# Altium schematic symbol library LimeMicroAltiumLib_schLib_r01.SchLib: 328 symbols (part 8 of 9)
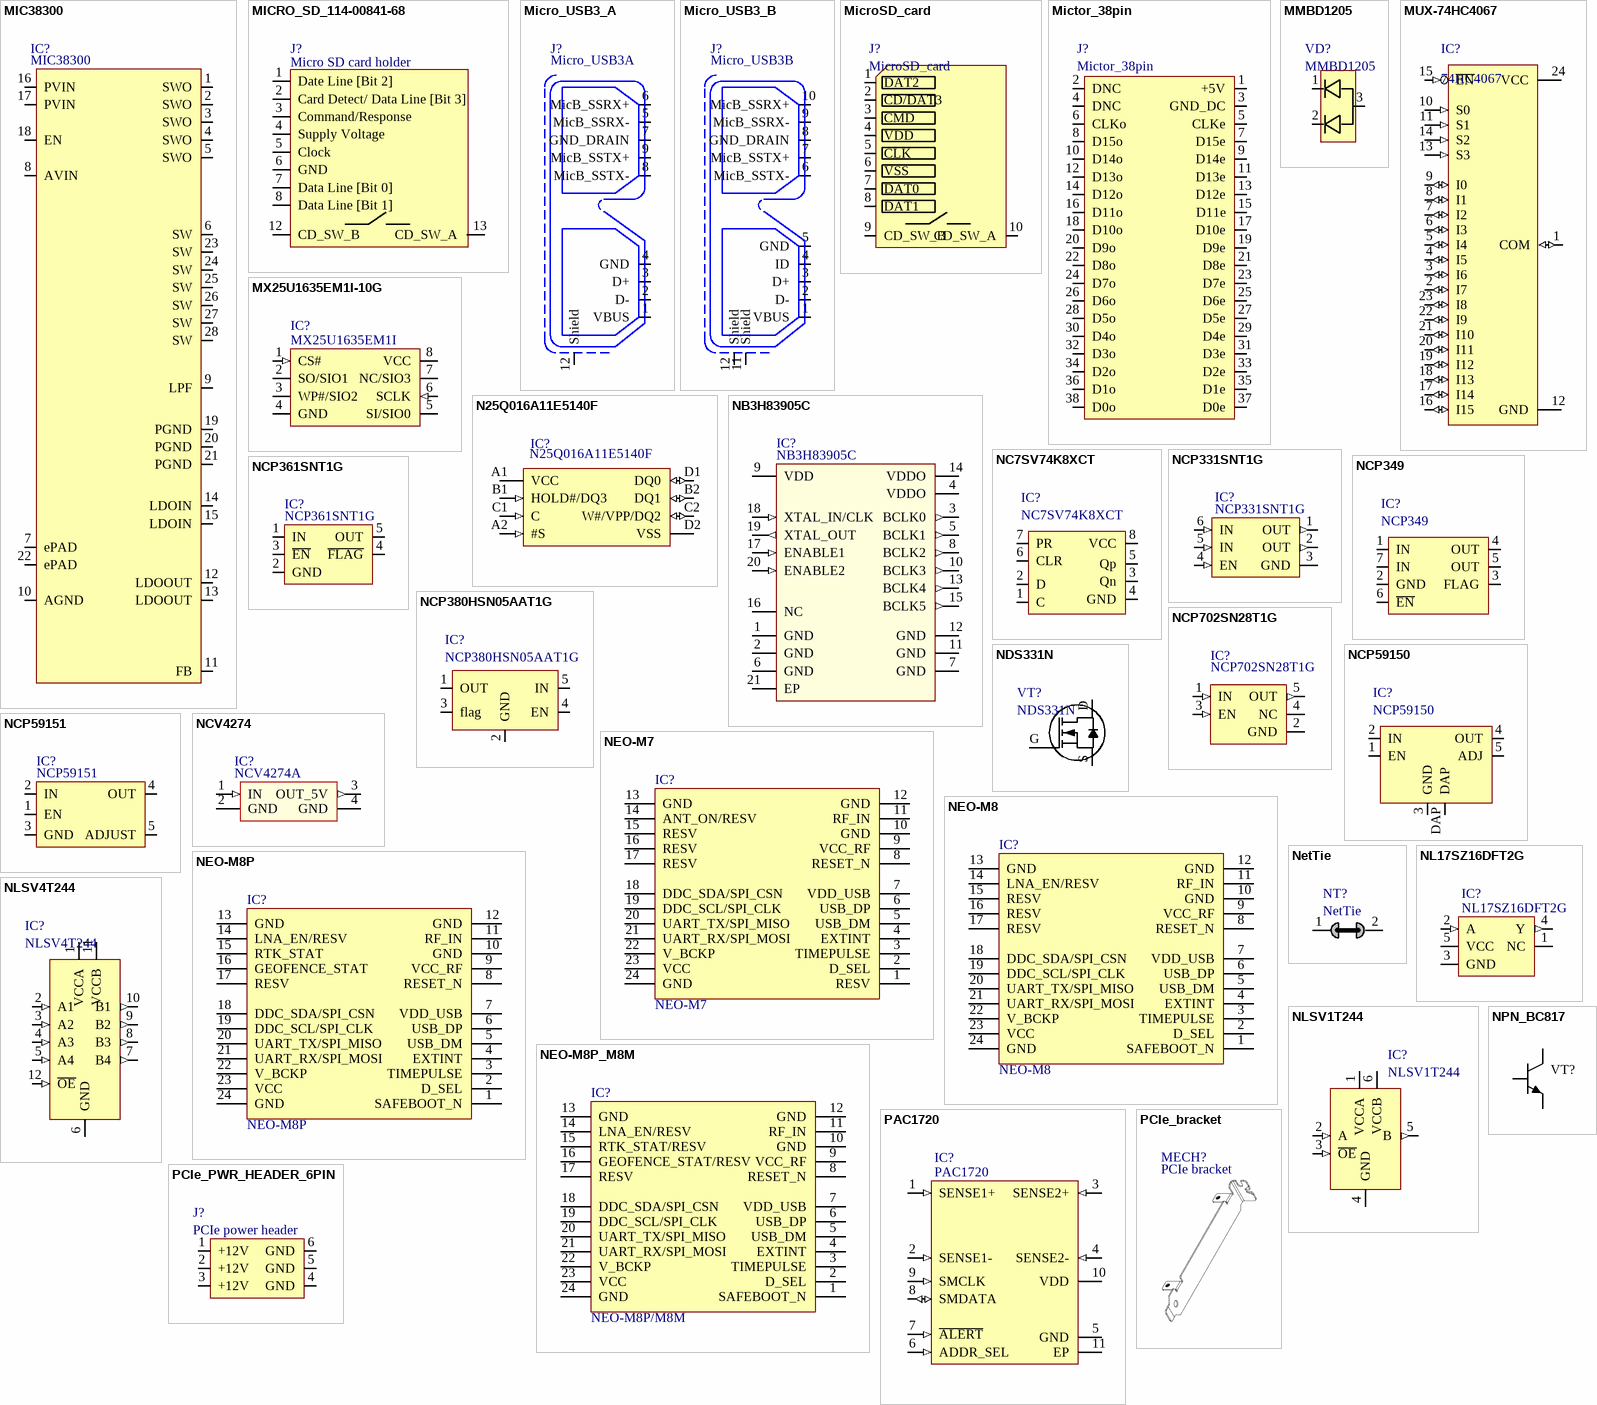
[diagram p54: symbols MIC38300 to PCIe_PWR_HEADER_6PIN]

## MMBD1205
designator VD?
Reverse Recovery Time (trr): 4ns; Diode Configuration: 1 Pair Common Anode; Voltage - DC Reverse (Vr) (Max): 100V; Current - Average Rectified (Io) (per Diode): 200mA; Current - Reverse Leakage @ Vr: 50nA @ 50V; Voltage - Forward (Vf) (Max) @ If: 1V @ 200mA; Supplier 1: Digi-Key; Category: Discrete Semiconductor Products; Supplier Device Package: SOT-23-3 (TO-236); Package / Case: TO-236-3, SC-59, SOT-23-3; Supplier Part Number 1: MMBD1205CT-ND
footprint SOT23-3_v2 (SOT23, 3 pin)
pins: 1, 2, 3

## MUX-74HC4067
designator IC?, comment 74HC4067
MUX-74HC4067; Manufacturer Part Number 1: 74HC4067PW,118; Manufacturer: NXP Semiconductors; Function: Multiplexer/Demultiplexer; On-State Resistance: 120 Ohm; Circuit: 1 x 1:16; Current - Supply: 16µA; Voltage - Supply, Single/Dual (±): 2 V ~ 10 V; Voltage Supply Source: Single Supply; Supplier 1: Digi-Key; Mounting Type: Surface Mount; Supplier Device Package: 24-TSSOP; Packaging: Tape & Reel (TR); RoHS: RoHS Compliant; Operating Temperature: -40°C ~ 125°C; Category: Integrated Circuits (ICs); Package / Case: 24-TSSOP (0.173", 4.40mm Width); Supplier Part Number 1: 74HC4067PW,118-ND
footprint SSOP-24 (SOP, 24-Leads, Body 8,5x5,6mm (max), Pitch 0,65mm, IPC Medium Density)
footprint SSOP-24 (SOP, 24-Leads, Body 8,5x5,6mm (max), Pitch 0,65mm, IPC Medium Density)
pins: 1 COM (io), 2 I7 (io), 3 I6 (io), 4 I5 (io), 5 I4 (io), 6 I3 (io), 7 I2 (io), 8 I1 (io), 9 I0 (io), 10 S0 (in), 11 S1 (in), 12 GND (power), 13 S3 (in), 14 S2 (in), 15 ~{EN} (in), 16 I15 (io), 17 I14 (io), 18 I13 (io), 19 I12 (io), 20 I11 (io), 21 I10 (io), 22 I9 (io), 23 I8 (io), 24 VCC (power)

## MX25U1635EM1I-10G
designator IC?, comment MX25U1635EM1I
Manufacturer: Macronix; Manufacturer Part Number: MX25U1635EM1I-10G; Part Description: FLASH - NOR Memory IC 16Mb (2M x 8) SPI 104MHz 8-SOP; Memory Type: Non-Volatile; Memory Format: FLASH; Memory Size: 16Mb (2M x 8); Write Cycle Time - Word, Page: 30µs, 3ms; Memory Interface: SPI; Voltage - Supply: 1.65 V ~ 2 V; Supplier 1: Digi-Key; RoHS: RoHS Compliant; Category: Integrated Circuits (ICs); Stock 1: 29792; Pricing 1: 1=1.27, 500=0.98924 (USD); Packaging: Tube; Part Status: Not For New Designs; Technology: FLASH - NOR; Operating Temperature: -40°C ~ 85°C (TA); Mounting Type: Surface Mount; Package / Case: 8-SOIC (0.154", 3.90mm Width); Supplier Device Package: 8-SOP; ComponentLink1URL: http://www.macronix.com/Lists/Datasheet/Attachments/6247/MX25U1635E,%201.8V,%2016Mb,%20v2.1.pdf; ComponentLink1Description: http://www.macronix.com/Lists/Datasheet/Attachments/6247/MX25U1635E,%201.8V,%2016Mb,%20v2.1.pdf; Supplier Part Number 1: 1092-1123-ND
footprint MX25U1635EM1I-10G_SOP8_150mil (8-Pin Small Outline Integrated Circuit 1.27 mm Pitch)
pins: 1 CS# (in), 2 SO/SIO1 (io), 3 WP#/SIO2 (io), 4 GND, 5 SI/SIO0 (io), 6 SCLK (in), 7 NC/SIO3 (io), 8 VCC

## N25Q016A11E5140F
designator IC?
Manufacturer: Micron Technology Inc.; Manufacturer Part Number 1: N25Q016A11E5140F TR; Part Description: IC FLASH 16MBIT 108MHZ LBGA; Voltage - Supply: 1.7 V ~ 2 V; Speed: 108MHz; Interface: SPI Serial; Memory Size: 16M (4M x 4); Memory Type: FLASH - NOR; Format - Memory: FLASH; Supplier 1: Digi-Key; Supplier Device Package: 8-XFCSP (2x2.8); RoHS: RoHS Compliant; Packaging: Cut Tape (CT); Package / Case: 8-XFBGA, CSPBGA; Operating Temperature: -40°C ~ 85°C (TA); Category: Integrated Circuits (ICs); Supplier Part Number 1: 557-1634-1-ND
footprint N25Q016A11E5140F (2.8 x 2 16 MB memory)
pins: A1 VCC (power), A2 #S (in), B1 HOLD#/DQ3 (in), B2 DQ1 (io), C1 C (in), C2 W#/VPP/DQ2 (io), D1 DQ0 (io), D2 VSS

## NB3H83905C
designator IC?
Manufacturer: ON Semiconductor; Manufacturer Part Number 1: NB3H83905CMNG; Part Description: Clock Fanout Buffer (Distribution) IC 100MHz 20-VFQFN Exposed Pad; Output: LVCMOS, LVTTL; Voltage - Supply: 1.6 V ~ 3.465 V; Input: LVCMOS, LVTTL, Crystal; Ratio - Input:Output: 1:6; Number of Circuits: 1; Frequency - Max: 100MHz; Differential - Input:Output: No/No; Supplier 1: Digi-Key; Packaging: Tape & Reel (TR); Operating Temperature: -40°C ~ 85°C; Type: Fanout Buffer (Distribution); Mounting Type: Surface Mount; Category: Integrated Circuits (ICs); RoHS: RoHS Compliant; Package / Case: 20-VFQFN Exposed Pad; Supplier Device Package: 20-QFN (3x4); Supplier Part Number 1: NB3H83905CMNGOS-ND
footprint NB3H83905C_20QFN (QFN, 20-Leads, Body 4,00x4,00mm, Pitch 0,50mm, Thermal Pad 2,70x2,70mm, IPC Medium Density)
pins: 1 GND, 2 GND, 3 BCLK0 (out), 4 VDDO (power), 5 BCLK1 (out), 6 GND, 7 GND, 8 BCLK2 (out), 9 VDD (power), 10 BCLK3 (out), 11 GND, 12 GND, 13 BCLK4 (out), 14 VDDO (power), 15 BCLK5 (out), 16 NC, 17 ENABLE1 (in), 18 XTAL_IN/CLK (in), 19 XTAL_OUT (out), 20 ENABLE2 (in), 21 EP

## NC7SV74K8XCT
designator IC?
Manufacturer: Fairchild Semiconductor; Max Propagation Delay @ V, Max CL: 2.8ns @ 3.3V, 30pF; Frequency - Clock: 200MHz; Current - Output High, Low: 24mA, 24mA; Current - Quiescent: 0.9µA; Number of Bits per Element: 1; Trigger Type: Positive Edge; Output Type: Differential; Function: Set(Preset) and Reset; Input Capacitance: 2pF; Voltage - Supply: 0.9 V ~ 3.6 V; Supplier 1: Digi-Key; Operating Temperature: -40°C ~ 85°C (TA); Mounting Type: Surface Mount; Package / Case: 8-VFSOP (0.091", 2.30mm Width); Packaging: Cut Tape (CT); Number of Elements: 1; Manufacturer Part Number 1: NC7SV74K8X; RoHS: RoHS Compliant; Type: D-Type; Category: Integrated Circuits (ICs); Supplier Part Number 1: NC7SV74K8XCT-ND
footprint NC7SV74K8XCT (SOIC, 8-Leads, Body 2,00x2,30mm, Pitch 1,27mm, IPC Medium Density)
pins: 1 C, 2 D, 3 Qn, 4 GND, 5 Qp, 6 CLR, 7 PR, 8 VCC

## NCP331SNT1G
designator IC?
Manufacturer: ON Semiconductor; Part Description: IC LOAD SWITCH SOFT START 6TSOP; Switch Type: General Purpose; Number of Outputs: 1; Ratio - Input:Output: 1:1; Output Configuration: High Side; Output Type: N-Channel; Interface: On/Off; Voltage - Load: 1.8 V ~ 5.5 V; Voltage - Supply (Vcc/Vdd): Not Required; Current - Output (Max): 2A; Rds On (Typ): 33 mOhm; Supplier 1: Digi-Key; Manufacturer Part Number: NCP331SNT1G; RoHS: RoHS Compliant; Category: Integrated Circuits (ICs); Stock 1: 3079; Pricing 1: 1=0.73, 10=0.646, 100=0.4951, 500=0.3914, 1000=0.31312 (USD); Packaging: Cut Tape (CT); Part Status: Active; Input Type: -; Features: Load Discharge, Slew Rate Controlled; Fault Protection: -; Operating Temperature: -40°C ~ 85°C (TA); Package / Case: SOT-23-6 Thin, TSOT-23-6; Supplier Device Package: 6-TSOP; ComponentLink1URL: http://www.onsemi.com/pub/Collateral/NCP331-D.PDF; ComponentLink1Description: http://www.onsemi.com/pub/Collateral/NCP331-D.PDF; Supplier Part Number 1: NCP331SNT1GOSCT-ND
footprint NCP331SNT1G_SOT23-6
pins: 1 OUT (out), 2 OUT (out), 3 GND, 4 EN (in), 5 IN (in), 6 IN (in)

## NCP349
designator IC?
Manufacturer: ON Semiconductor; Manufacturer Part Number 1: NCP349MNAETBG; Current - Supply: 70µA; Voltage - Supply: 1.2 V ~ 28 V; Supplier 1: Digi-Key; Operating Temperature: -40°C ~ 85°C; Package / Case: 6-VFDFN Exposed Pad; RoHS: RoHS Compliant; Supplier Device Package: 6-DFN (2x1.6); Category: Integrated Circuits (ICs); Mounting Type: Surface Mount; Voltage - Input: -; Applications: Overvoltage Protection Controller; Packaging: Digi-Reel®; Supplier Part Number 1: NCP349MNAETBGOSDKR-ND
footprint NCP349 (SON, 6-Leads, Body 1,60x2,00mm, Pitch 0,50mm, Thermal Pad 1,20x0,79mm, IPC Medium Density)
pins: 1 IN, 2 GND, 3 FLAG, 4 OUT, 5 OUT, 6 ~{EN}, 7 IN

## NCP361SNT1G
designator IC?
Manufacturer: ON Semiconductor; Part Description: IC USB POS OVP/OCP 5TSOP; Supplier 1: Digi-Key; Manufacturer Part Number 1: NCP361SNT1G; RoHS: RoHS Compliant; Category: Circuit Protection; Stock 1: 11078; Pricing 1: 1=0.76, 10=0.673, 100=0.516, 500=0.40788, 1000=0.3263 (USD); Packaging: Cut Tape (CT); Part Status: Active; Voltage - Clamping: -; Technology: Mixed Technology; Applications: General Purpose; Mounting Type: Surface Mount; Package / Case: SOT-23-5 Thin, TSOT-23-5; Supplier Device Package: 5-TSOP; ComponentLink1URL: http://www.onsemi.com/pub/Collateral/NCP361-D.PDF; ComponentLink1Description: http://www.onsemi.com/pub/Collateral/NCP361-D.PDF; Supplier Part Number 1: NCP361SNT1GOSCT-ND
footprint NCP361SNT1G_TSOP5
pins: 1 IN (in), 2 GND, 3 ~{EN} (in), 4 ~{FLAG} (out), 5 OUT (out)

## NCP380HSN05AAT1G
designator IC?
Manufacturer: ON Semiconductor; Voltage - Input: 2.5 V ~ 5.5 V; Function: Current Limiting; Current - Output: 500mA; Supplier 1: Digi-Key; Category: Integrated Circuits (ICs); Package / Case: 6-TSOP (0.059", 1.50mm Width) 5 leads; Supplier Part Number 1: NCP380HSN05AAT1GOSCT-ND
footprint SOT23-5
pins: 1 OUT, 2 GND, 3 flag, 4 EN, 5 IN

## NCP702SN28T1G
designator IC?
Manufacturer: ON Semiconductor; Part Description: Linear Voltage Regulator IC Positive Fixed 1 Output 2.8V 200mA 5-TSOP; Output Configuration: Positive; Output Type: Fixed; Voltage - Input (Max): 5.5V; Voltage - Output (Min/Fixed): 2.8V; Current - Output: 200mA; Control Features: Enable; Protection Features: Over Current, Over Temperature, Soft Start, Under Voltage Lockout (UVLO); Supplier 1: Digi-Key; Manufacturer Part Number 1: NCP702SN28T1G; RoHS: RoHS Compliant; Category: Integrated Circuits (ICs); Stock 1: 5251; Pricing 1: 1=0.8, 10=0.707, 100=0.542, 500=0.42848, 1000=0.34278 (USD); Packaging: Cut Tape (CT); Part Status: Active; Voltage - Output (Max): -; Voltage Dropout (Max): -; PSRR: -; Operating Temperature: -40°C ~ 125°C; Mounting Type: Surface Mount; Package / Case: SOT-23-5 Thin, TSOT-23-5; Supplier Device Package: 5-TSOP; Base Part Number: NCP702; ComponentLink1URL: http://www.onsemi.com/pub/Collateral/NCP702-D.PDF; ComponentLink1Description: http://www.onsemi.com/pub/Collateral/NCP702-D.PDF; Supplier Part Number 1: NCP702SN28T1GOSCT-ND
footprint NCP702SN28T1GOSCT-ND_SOT23-5
pins: 1 IN (in), 2 GND, 3 EN (in), 4 NC, 5 OUT (out)

## NCP59150
designator IC?
Manufacturer Part Number 1: NCP59151DS50R4G; Manufacturer: ON SEMICONDUCTOR; Input Voltage Min: 2.24; Dropout Voltage Vdo: 300; Output Voltage Nom.: 5; Input Voltage Max: 13.5; Output Current: 1.5; LDO Regulator Case Style: TO-263; Supplier 1: Farnell; Operating Temperature Range: -40°C to +125; Supplier Part Number 1: 2217055
footprint DPAK170P1420X450-6N (D2-PAK, 6-Pads, Body 7,75x8,46mm (max), IPC Medium Density)
pins: 1 EN, 2 IN, 3 GND, 4 OUT, 5 ADJ, DAP

## NCP59151
designator IC?
Manufacturer Part Number 1: NCP59151DS50R4G; Manufacturer: ON Semiconductor; Voltage - Output: 5V; Voltage - Dropout (Typical): 0.3V @ 1.5A; Regulator Topology: Positive Fixed; Voltage - Input: Up to 13.5V; Current - Output: 1.5A; Number of Regulators: 1; Supplier 1: Digi-Key; Mounting Type: Surface Mount; Operating Temperature: -40°C ~ 125°C; Supplier Device Package: D2PAK-5; Package / Case: TO-263-6, D²Pak (5 Leads + Tab), TO-263BA; RoHS: RoHS Compliant; Category: Integrated Circuits (ICs); Packaging: Digi-Reel®; Current - Limit (Min): -; Supplier Part Number 1: NCP59151DS50R4GOSDKR-ND
footprint TO-263-5 (D-PAK/TO-263-5; 5 Leads; Body 14.4 (inc. leads) x 10.4 mm (LxW max))
pins: 1 EN (in), 2 IN (in), 3 GND, 4 OUT (out), 5 ADJUST (in)

## NCV4274
designator IC?, comment NCV4274A
Manufacturer Part Number 1: NCV4274ADT50RKG; Manufacturer: ON Semiconductor; Part Description: Linear Voltage Regulator IC Positive Fixed 1 Output 5V 400mA DPAK-3; Voltage - Output: 5V; Voltage - Dropout (Typical): 0.25V @ 250mA; Current - Output: 400mA; Regulator Topology: Positive Fixed; Voltage - Input: 5.5 V ~ 40 V; Number of Regulators: 1; Supplier 1: Digi-Key; RoHS: RoHS Compliant; Supplier Device Package: DPAK-3; Package / Case: TO-252-3, DPak (2 Leads + Tab), SC-63; Mounting Type: Surface Mount; Category: Integrated Circuits (ICs); Current - Limit (Min): 400mA; Operating Temperature: -40°C ~ 150°C; Packaging: Cut Tape (CT); Supplier Part Number 1: NCV4274ADT50RKGOSCT-ND
footprint D2PAK-3 (D-PAK/TO-263-3; 3 Leads (1 Cropped); Body 14.7 (inc. leads) x 10.2 mm (LxW max))
pins: 1 IN (in), 2 GND, 3 OUT_5V (out), 4 GND

## NDS331N
designator VT?
Gate Charge (Qg) @ Vgs: 5nC @ 4.5V; Power - Max: 460mW; Current - Continuous Drain (Id) @ 25°C: 1.3A (Ta); Input Capacitance (Ciss) @ Vds: 162pF @ 10V; FET Type: MOSFET N-Channel, Metal Oxide; Drain to Source Voltage (Vdss): 20V; FET Feature: Logic Level Gate; Supplier Device Package: 3-SSOT; Category: Discrete Semiconductor Products; Mounting Type: Surface Mount; Package / Case: TO-236-3, SC-59, SOT-23-3; Supplier: Digi-Key; Supplier Part Number 1: NDS331NCT-ND
footprint SOT23-3 (SOT23, 3 pin)
pins: D, G, S

## NEO-M7
designator IC?
GNSS engine for GPS/QZSS, GLONASS; Manufacturer: U-blox; DatasheetVersion: R07 11-Nov-2014; PackageDescription: NEO-7 series 12.2 x 16 x 2.4 mm; ComponentLink1URL: https://www.u-blox.com/en/product/neo-7-series; ComponentLink2Description: Datasheet; ComponentLink1Description: https://www.u-blox.com/en/product/neo-7-series
pins: 1 RESV, 2 D_SEL, 3 TIMEPULSE, 4 EXTINT, 5 USB_DM, 6 USB_DP, 7 VDD_USB, 8 RESET_N, 9 VCC_RF, 10 GND, 11 RF_IN, 12 GND, 13 GND, 14 ANT_ON/RESV, 15 RESV, 16 RESV, 17 RESV, 18 DDC_SDA/SPI_CSN, 19 DDC_SCL/SPI_CLK, 20 UART_TX/SPI_MISO, 21 UART_RX/SPI_MOSI, 22 V_BCKP, 23 VCC, 24 GND

## NEO-M8
designator IC?
GNSS engine for GPS/QZSS, GLONASS; Manufacturer: U-blox; DatasheetVersion: R07 11-Nov-2014; PackageDescription: NEO-7 series 12.2 x 16 x 2.4 mm; ComponentLink1URL: https://www.u-blox.com/en/product/neo-7-series; ComponentLink2Description: Datasheet; ComponentLink1Description: https://www.u-blox.com/en/product/neo-7-series
pins: 1 SAFEBOOT_N, 2 D_SEL, 3 TIMEPULSE, 4 EXTINT, 5 USB_DM, 6 USB_DP, 7 VDD_USB, 8 RESET_N, 9 VCC_RF, 10 GND, 11 RF_IN, 12 GND, 13 GND, 14 LNA_EN/RESV, 15 RESV, 16 RESV, 17 RESV, 18 DDC_SDA/SPI_CSN, 19 DDC_SCL/SPI_CLK, 20 UART_TX/SPI_MISO, 21 UART_RX/SPI_MOSI, 22 V_BCKP, 23 VCC, 24 GND

## NEO-M8P
designator IC?
GNSS engine for GPS/QZSS, GLONASS; Manufacturer: U-blox; DatasheetVersion: R07 11-Nov-2014; PackageDescription: NEO-7 series 12.2 x 16 x 2.4 mm; ComponentLink1URL: https://www.u-blox.com/en/product/neo-7-series; ComponentLink2Description: Datasheet; ComponentLink1Description: https://www.u-blox.com/en/product/neo-7-series
pins: 1 SAFEBOOT_N, 2 D_SEL, 3 TIMEPULSE, 4 EXTINT, 5 USB_DM, 6 USB_DP, 7 VDD_USB, 8 RESET_N, 9 VCC_RF, 10 GND, 11 RF_IN, 12 GND, 13 GND, 14 LNA_EN/RESV, 15 RTK_STAT, 16 GEOFENCE_STAT, 17 RESV, 18 DDC_SDA/SPI_CSN, 19 DDC_SCL/SPI_CLK, 20 UART_TX/SPI_MISO, 21 UART_RX/SPI_MOSI, 22 V_BCKP, 23 VCC, 24 GND

## NEO-M8P_M8M
designator IC?, comment NEO-M8P/M8M
GNSS engine for GPS/QZSS, GLONASS; Manufacturer: U-blox; DatasheetVersion: R07 11-Nov-2014; PackageDescription: NEO-7 series 12.2 x 16 x 2.4 mm; ComponentLink1URL: https://www.u-blox.com/en/product/neo-7-series; ComponentLink2Description: Datasheet; ComponentLink1Description: https://www.u-blox.com/en/product/neo-7-series
pins: 1 SAFEBOOT_N, 2 D_SEL, 3 TIMEPULSE, 4 EXTINT, 5 USB_DM, 6 USB_DP, 7 VDD_USB, 8 RESET_N, 9 VCC_RF, 10 GND, 11 RF_IN, 12 GND, 13 GND, 14 LNA_EN/RESV, 15 RTK_STAT/RESV, 16 GEOFENCE_STAT/RESV, 17 RESV, 18 DDC_SDA/SPI_CSN, 19 DDC_SCL/SPI_CLK, 20 UART_TX/SPI_MISO, 21 UART_RX/SPI_MOSI, 22 V_BCKP, 23 VCC, 24 GND

## NetTie
designator NT?  (net tie, no BOM)
pins: 1, 2

## NL17SZ16DFT2G
designator IC?
Manufacturer: ON Semiconductor; Part Description: Buffer, Non-Inverting 1 Element 1 Bit per Element Push-Pull Output SC-88A (SC-70-5/SOT-353); Logic Type: Buffer, Non-Inverting; Number of Bits per Element: 1; Output Type: Push-Pull; Current - Output High, Low: 32mA, 32mA; Voltage - Supply: 1.65 V ~ 5.5 V; Supplier 1: Digi-Key; Manufacturer Part Number 1: NL17SZ16DFT2G; RoHS: RoHS Compliant; Category: Integrated Circuits (ICs); Stock 1: 2190; Pricing 1: 1=0.34, 10=0.28, 100=0.1485, 500=0.09772, 1000=0.06645 (USD); Packaging: Cut Tape (CT); Part Status: Active; Input Type: -; Operating Temperature: -55°C ~ 125°C (TA); Mounting Type: Surface Mount; Package / Case: 5-TSSOP, SC-70-5, SOT-353; Supplier Device Package: SC-88A (SC-70-5/SOT-353); Base Part Number: 17SZ16; ComponentLink1URL: http://www.onsemi.com/pub/Collateral/NL17SZ16-D.PDF; ComponentLink1Description: http://www.onsemi.com/pub/Collateral/NL17SZ16-D.PDF; Supplier Part Number 1: NL17SZ16DFT2GOSCT-ND
footprint NL17SZ16_SOT23-5
pins: 1 NC, 2 A (in), 3 GND, 4 Y (out), 5 VCC (power)

## NLSV1T244
designator IC?
pins: 1 VCCA (power), 2 A (in), 3 ~{OE} (in), 4 GND (power), 5 B (out), 6 VCCB (power)

## NLSV4T244
designator IC?
Manufacturer: ON Semiconductor; Voltage - Supply: 0.9 V ~ 4.5 V; Logic Function: Translator, Unidirectional, 3-State; Supplier 1: Digi-Key; Category: Integrated Circuits (ICs); Package / Case: 12-UFQFN; Supplier Device Package: 12-UQFN (1.7x2); Supplier Part Number 1: NLSV4T244MUTAGOSDKR-ND
footprint NLSV4T244 (PQFN, 12-Leads, Body 1,70x2,00mm, Pitch 0,40mm, IPC Medium Density)
pins: 1 VCCA (power), 2 A1 (in), 3 A2 (in), 4 A3 (in), 5 A4 (in), 6 GND (power), 7 B4 (out), 8 B3 (out), 9 B2 (out), 10 B1 (out), 11 VCCB (power), 12 ~{OE} (in)

## NPN_BC817
designator VT?  (value not drawn)
Transistor SOT-23; Manufacturer Part Number 1: BC817; Manufacturer: MULTICOMP; Transistor Polarity: NPN; Collector Emitter Voltage V(br)ceo: 45; Transition Frequency ft: 170; Power Dissipation Pd: 300; DC Collector Current: 500; DC Current Gain hFE: 100; No. of Pins: 3; SVHC: No SVHC (16-Jun-2014); DC Current Gain Hfe Max: 600; Supplier 1: Farnell; RoHS: YES; Transistor Case Style: SOT-23; Operating Temperature Max: 150; MSL: -; Operating Temperature Min: -65; Operating Temperature Range: -65°C to +150; Supplier Part Number 1: 1798076
footprint SOT23-3_v2 (SOT23, 3 pin)
pins: 1 B, 2 E, 3 C

## PAC1720
designator IC?
Part Description: Current Sense Regulator High-Side 10-DFN (3x3); Manufacturer Part Number 1: PAC1720-1-AIA-TR; Manufacturer: Microchip Technology; Voltage - Input: 0 V ~ 40 V; Sensing Method: High-Side; Function: Current Sense; Accuracy: ±1%; Supplier 1: Digi-Key; Category: Integrated Circuits (ICs); Supplier Device Package: 10-DFN (3x3); Packaging: Cut Tape (CT); Part Status: Active; Current - Output: -; Package / Case: 10-VFDFN Exposed Pad; Operating Temperature: -40°C ~ 85°C; Mounting Type: Surface Mount; RoHS: RoHS Compliant; Supplier Part Number 1: PAC1720-1-AIA-CT-ND
footprint PAC1720_VDFN (10-Lead Very Thin Plastic Dual Flat, No Lead Package (9Q) - 3x3 mm Body [VDFN])
pins: 1 SENSE1+ (in), 2 SENSE1- (in), 3 SENSE2+ (in), 4 SENSE2- (in), 5 GND, 6 ADDR_SEL (in), 7 ~{ALERT} (in), 8 SMDATA (io), 9 SMCLK (in), 10 VDD (power), 11 EP

## PCIe_bracket
designator MECH?, comment PCIe bracket
Manufacturer: Keystone Electronics; Manufacturer Part Number 1: 9203; Part Description: BRACKET, COMPUTER, PCI,LENGTH 120mm, HOLE TO HOLE DISTANCE 85.4mm; Card Type: PCI; Style: Blank; Supplier 1: Digi-Key; RoHS: RoHS Compliant; Category: Computers, Office - Components, Accessories; Stock 1: 5093; Pricing 1: 1=3.31, 10=2.083, 50=1.87, 100=1.785, 250=1.615, 1000=1.44, 2500=1.28001, 5000=1.1305 (USD); Part Status: Active; Material: Steel, Nickel Plated; ComponentLink1URL: http://www.keyelco.com/product-pdf.cfm?p=2468; ComponentLink1Description: http://www.keyelco.com/product-pdf.cfm?p=2468; Supplier Part Number 1: 36-9203-ND
footprint PCIe_bracket

## PCIe_PWR_HEADER_6PIN
designator J?, comment PCIe power header
Manufacturer Part Number 1: 0455580003; Manufacturer: Molex Connector Corporation; Number of Positions Loaded: All; Pitch: 0.165" (4.20mm); Number of Positions: 6; Connector Type: Header, Shrouded; Supplier 1: Digi-Key; Contact Finish: Tin; Contact Finish Thickness: 100µin (2.54µm); Fastening Type: Locking Ramp; RoHS: RoHS Compliant; Contact Type: Male Pin; Features: Board Lock; Color: Black; Packaging: Tray; Mounting Type: Through Hole, Right Angle; Category: Connectors, Interconnects; Contact Mating Length: -; Row Spacing: 0.165" (4.20mm); Termination: Solder; Number of Rows: 2; Supplier Part Number 1: WM10869-ND
footprint PCIe_POWER_HEADER_6PIN
pins: 1 +12V, 2 +12V, 3 +12V, 4 GND, 5 GND, 6 GND
